# Altium footprint library hphonglib.PcbLib: 1250 footprints (part 77 of 79)
Each footprint in its own frame and in the unit in brackets; x right, y up, seen from the top. Pads: shape width x height; smd on the part's side, far side on the other; paste and mask are expansions set on the pad; w line width, h text height; cw(c..) or ccw(c..) is an arc to the next point about the centre after c.
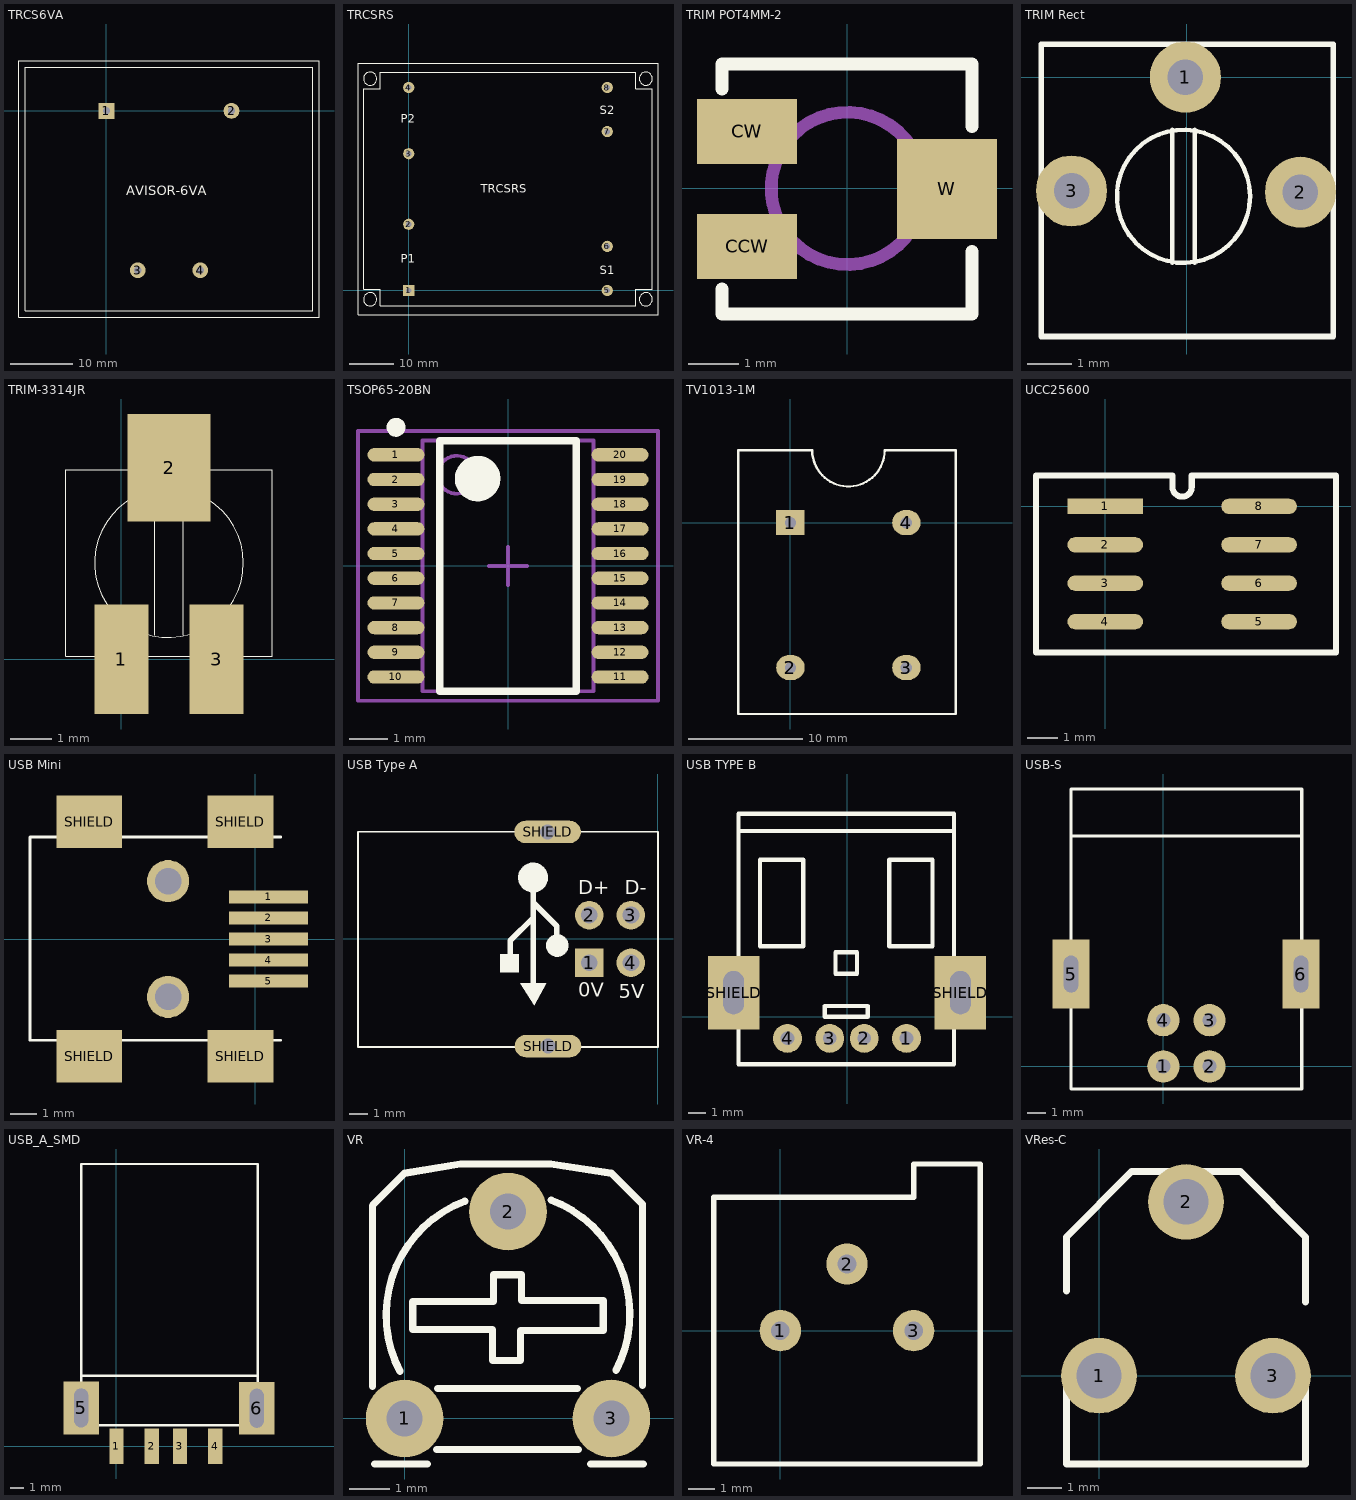
[diagram p76: the footprints below, top view; thin cyan lines are the x and y axes]

## TRCS6VA [mm] "Transformer"
pads (4):
  rect 2.54x2.54 hole 1.2: 1(0,0)
  round 2.54 hole 1.2: 2(20,0) 3(5,-25.5) 4(15,-25.5)
Top Overlay:
  lines w0.127: -14,-33 34,-33 34,8 -14,8 -14,-33 ; -13,-32 33,-32 33,7 -13,7 -13,-32
  text "AVISOR-6VA" at 3.175,-13.462 h1.54

## TRCSRS [mm] "Transformer Power 6VA - Body 68x57 mm RS type"
pads (8):
  rect 2.54x2.54 hole 1.2: 1(0,0)
  round 2.54 hole 1.2: 2(0,15) 3(0,31) 4(0,46) 5(45,0) 6(45,10) 7(45,36) 8(45,46)
Top Overlay:
  circle w0.127: c53.75,-2 r1.5
  circle w0.127: c53.75,48 r1.5
  circle w0.127: c-8.75,48 r1.5
  circle w0.127: c-8.75,-2 r1.5
  lines w0.127: -11.5,-5.5 -11.5,51.5 56.5,51.5 56.5,-5.5 -11.5,-5.5 ; -10.25,0.25 -10.25,45.75 -6.5,45.75 -6.5,49.5 51.5,49.5 51.5,45.75 55.25,45.75 55.25,0.25 51.5,0.25 51.5,-3.5 -6.5,-3.5 -6.5,0.25 -10.25,0.25
  text "S1" at 43.278,3.695 h1.93
  text "S2" at 43.278,39.89 h1.93
  text "P1" at -1.807,6.235 h1.93
  text "P2" at -1.807,37.985 h1.93
  text "TRCSRS" at 16.308,22.11 h1.93

## TRIM POT4MM-2 [mm] "Bien tro tinh chinh"
pads (3):
  rect 2x1.3 smd: CCW(-2.008,-1.162) CW(-2.008,1.138)
  rect 2x2 smd: W(1.992,-0.012)
Top Overlay:
  lines w0.254: -2.508,-2.012 -2.508,-2.512 2.492,-2.512 2.492,-1.262 ; -2.508,1.988 -2.508,2.488 2.492,2.488 2.492,1.238
Mechanical 2:
  circle w0.254: c0,0 r1.524
3D body: height 3.05, standoff 0, extent -1.519,0.132 1.519,1.525
3D body: height 3.05, standoff 0, extent -1.519,-1.525 1.519,-0.132
3D body: height 0.64, standoff 0, extent 1.143,-0.889 2.921,0.889
3D body: height 0.64, standoff 0, extent -2.921,-1.651 -1.143,-0.635
3D body: height 0.64, standoff 0, extent -2.921,0.635 -1.143,1.651
3D body: height 2.54, standoff 0, extent -2.54,-2.413 2.54,2.413
3D body: height 2.67, standoff 0, extent -1.436,-1.436 1.436,1.436

## TRIM Rect [mm]
pads (3):
  round 1.6 hole 0.8: 1(-0.025,0) 2(2.565,-2.591) 3(-2.591,-2.565)
Top Overlay:
  circle w0.1: c-0.069,-2.686 r1.5
  lines w0.1: -0.319,-4.186 -0.319,-1.186 ; 0.181,-4.186 0.181,-1.186
  lines w0.127: -3.277,-5.842 3.302,-5.842 3.302,0.737 -3.277,0.737 -3.277,-5.842
3D body "POT1.STEP": height 4.4, standoff -3, extent -3.275,-5.867 3.325,0.733

## TRIM-3314JR [mm]
pads (3):
  rect 1.3x2.65 smd: 1(0,0) 3(2.3,0)
  rect 2x2.6 smd: 2(1.15,4.625)
Top Overlay:
  circle w0.025: c1.15,2.325 r1.8
  lines w0.025: 0.8,0.575 0.8,4.075 ; 1.5,0.575 1.5,4.075 ; -1.35,0.075 3.65,0.075 3.65,4.575 -1.35,4.575 -1.35,0.075

## TSOP65-20BN [mm] "TSOP, 20-Leads, Body 6.5x4.4mm, Pitch 0.65mm, IPC Medium Density"
height 1.2
pads (20):
  oval 1.5x0.35 smd: 1(-2.95,2.925) 2(-2.95,2.275) 3(-2.95,1.625) 4(-2.95,0.975) 5(-2.95,0.325) 6(-2.95,-0.325) 7(-2.95,-0.975) 8(-2.95,-1.625) 9(-2.95,-2.275) 10(-2.95,-2.925) 11(2.95,-2.925) 12(2.95,-2.275) 13(2.95,-1.625) 14(2.95,-0.975) 15(2.95,-0.325) 16(2.95,0.325) 17(2.95,0.975) 18(2.95,1.625) 19(2.95,2.275) 20(2.95,2.925)
Top Overlay:
  circle w0.25: c-2.95,3.65 r0.125
  circle w0.6: c-0.8,2.3 r0.3
  lines w0.2: -1.8,-3.3 -1.8,3.3 1.8,3.3 1.8,-3.3 -1.8,-3.3
Mechanical 13:
  circle w0.1: c-1.35,2.4 r0.5
  lines w0.1: -2.25,-3.3 -2.25,3.3 2.25,3.3 2.25,-3.3 -2.25,-3.3
Mechanical 15:
  lines w0.1: -0.5,0 0.5,0 ; 0,-0.5 0,0.5 ; -3.95,-3.55 -3.95,3.55 3.95,3.55 3.95,-3.55 -3.95,-3.55
3D body: height 1.2, standoff 0, extent -2.25,-3.3 2.25,3.3

## TV1013-1M [mm]
pads (4):
  rect 2.5x2.2 / inner rect 2.5x1.2 / far side rect 2.5x2.2 hole 1: 1(0,0)
  oval 2.5x2.2 / inner oval 2.5x1.2 / far side oval 2.5x2.2 hole 1: 2(0,-12.7) 3(10.16,-12.7) 4(10.16,0)
Top Overlay:
  lines w0.2: -4.572,-16.764 14.478,-16.764 14.478,6.35 8.255,6.35 cw(c5.08,6.35) 1.905,6.35 -4.572,6.35 -4.572,-16.764

## UCC25600 [mm] "Half bridge resonant"
pads (8):
  rect 2.5x0.5 smd: 1(0,0)
  oval 2.5x0.5 smd: 2(0,-1.27) 3(0,-2.54) 4(0,-3.81) 5(5.08,-3.81) 6(5.08,-2.54) 7(5.08,-1.27) 8(5.08,0)
Top Overlay:
  lines w0.2: -2.286,-4.826 7.62,-4.826 7.62,1.016 2.857,1.016 2.857,0.635 cw(c2.54,0.635) 2.222,0.635 2.222,1.016 -2.286,1.016 -2.286,-4.826

## USB Mini [mm] "USB Male Mini Type B Conn"
pads (11):
  rect 3x0.5 smd: 1(0.5,1.6) 2(0.5,0.8) 3(0.5,0) 4(0.5,-0.8) 5(0.5,-1.6)
  rect 2.5x2 smd: SHIELD(-6.318,-4.45) SHIELD(-6.318,4.45) SHIELD(-0.568,-4.45) SHIELD(-0.568,4.45)
  round 1.6 hole 1: ""(-3.318,-2.2) ""(-3.318,2.2)
Top Overlay:
  lines w0.1: 0.957,-3.85 -8.568,-3.85 -8.568,3.875 0.957,3.875
  text "." at 1.325,2.6 h0.5
3D body "USB_mini_B.STEP": height 3.95, standoff -1, extent -9.175,-5.375 0.025,5.325

## USB Type A [mm] "USB Male Type B Connector"
pads (6):
  rect 1.524x1.524 hole 0.9: 1(-3.672,-1.27)
  round 1.524 hole 0.9: 2(-3.672,1.27) 3(-1.449,1.27) 4(-1.449,-1.27)
  rrect100% 3.556x1.2 hole 0.8: SHIELD(-5.894,5.715) SHIELD(-5.875,-5.725)
Top Overlay:
  circle w0.6: c-5.382,-0.356 r0.3
  circle w0.8: c-6.674,3.277 r0.4
  region: -8.433,-0.813 -8.433,-1.803 -7.417,-1.803 -7.417,-0.813
  region: -6.617,-3.531 -7.353,-2.362 -5.956,-2.362
  lines w0.1: -16.025,-5.775 -16.025,5.725 0,5.725 0,-5.775 -16.025,-5.775
  lines w0.2: -6.655,1.876 -6.629,1.876 -6.604,1.876
  lines w0.3: -7.899,-0.864 -7.899,-0.127 ; -7.899,-0.102 -6.655,1.143 ; -6.655,-2.464 -6.655,2.718 ; -6.604,1.876 -5.41,0.683 -5.41,-0.279
  lines w0.8: -6.934,5.725 -4.826,5.725 ; -6.915,-5.715 -4.807,-5.715
  text "0V" at -4.267,-3.099 h0.76
  text "D-" at -1.778,2.388 h0.76
  text "D+" at -4.267,2.388 h0.76
  text "5V" at -2.108,-3.175 h0.76
Bottom Overlay:
  circle w0.8: c-6.699,3.277 r0.4
  circle w0.6: c-5.407,-0.356 r0.3
  region: -8.458,-0.813 -8.458,-1.803 -7.442,-1.803 -7.442,-0.813
  region: -6.642,-3.531 -7.379,-2.362 -5.982,-2.362
  lines w0.1: -16.025,-5.775 -16.025,5.725 ; 0,-5.775 0,5.725 ; -16.025,-5.766 -16.025,5.725 ; -16.025,-5.766 0,-5.766 ; -16.025,-5.766 0,-5.766 ; -16.025,5.725 0,5.725 ; -16.025,5.725 0,5.725 ; 0,-5.766 0,5.725
  lines w0.3: -7.925,-0.864 -7.925,-0.127 ; -7.925,-0.102 -6.68,1.143 ; -6.68,-2.464 -6.68,2.718 ; -6.629,1.876 -5.436,0.683 -5.436,-0.279
3D body "USB type B.STEP": height 11.5, standoff -3.92, extent -16.594,-7.442 0.406,7.441

## USB TYPE B [mil] "Connector; USB; Type B; Solder Pad 35mil"
pads (6):
  round 67 hole 32: 1(138,-50) 2(40,-50) 3(-40,-50) 4(-138,-50)
  rect 120x170 hole 48 slot 100 at 90 deg: SHIELD(-263,56) SHIELD(263,56)
Top Overlay:
  lines w10: -251.77,-100 -251.77,431 248.23,431 248.23,-100 ; -251.77,-110 248.23,-110 248.23,471 -251.77,471 -251.77,-110 ; -201.77,164 -101.77,164 -101.77,364 -201.77,364 -201.77,164 ; -51.77,0 -1.77,0 48.23,0 48.23,25 -51.77,25 -51.77,0 ; -26.77,100 -26.77,150 23.23,150 23.23,100 -26.77,100 ; 98.23,164 198.23,164 198.23,364 98.23,364 98.23,164
3D body "usb_a-usbsa.stp": height 275.59, standoff -151.76, extent -311.02,-105 311.02,465.87

## USB-S [mil] "USB B connector, 4pin, For Print"
height 100
pads (6):
  round 70 hole 31: 1(0,0) 2(100,0) 3(100,100) 4(0,100)
  rect 80x150 hole 31 slot 80 at 90 deg: 5(-200,200) 6(298,200)
Top Overlay:
  lines w7: -200,499 300,499 ; -200,-49 -200,601 300,601 300,-49 -200,-49
3D body "usb_a-usbsb.stp": height 421.26, standoff -155.51, extent -243.31,-39.61 343.31,610

## USB_A_SMD [mil] "For USB SMD"
height 150
pads (6):
  rect 40x100 smd: 1(0,0) 2(100,0) 3(180,0) 4(280,0)
  rect 100x150 hole 40 slot 110 at 90 deg: 5(-100,109) 6(398,108)
Top Overlay:
  lines w7: -100,200 400,200 ; -100,60 -100,800 400,800 400,60 -100,60
3D body "SW3dPS-USB Series A Plug.STEP": height 73.83, standoff -103.33, extent -93.44,62.17 379,783.83

## VR [mil] "Resistor Variable"
height 200
pads (3):
  round 75 hole 35: 1(0,0) 2(100,200) 3(200,0)
Top Overlay:
  lines w7: -31,31 -31,206 0,237 54,246 141.5,246 200,237 230,207 230,32 ; -29,-44 22,-44 ; -4.35,45.34 cw(c100,100) 58.1,210.1 ; 8,113 8,86 85,86 85,56 112,56 112,85 192,85 192,114 113,114 113,139 86,139 86,113 9,113 ; 31,-30 168,-30 ; 32,29 167,29 ; 141.9,211.1 cw(c100,101) 204.35,46.34 ; 180,-44 231,-44
3D body "SW3dPS-Trimpot Horizontal.STEP": height 165.35, standoff -220.47, extent -86.85,-30 306.85,371.57

## VR-4 [mil]
pads (3):
  round 62 hole 28: 1(0,0) 2(100,100) 3(200,0)
Top Overlay:
  lines w8: -100,-200 300,-200 300,250 200,250 200,200 -100,200 -100,-200

## VRes-C [mil] "Potentiometer; 3 Leads; Circle; Solder pad 35mil"
pads (3):
  round 87 hole 52: 1(0,0) 2(100,200) 3(200,0)
Top Overlay:
  lines w8: -37.5,-90.23 -37.5,-2.73 -37.5,-101.5 237.5,-101.5 237.5,9.77 237.5,-90.23 ; -37.5,159.77 37.5,234.77 ; -37.5,159.77 -37.5,97.27 -37.5,159.77 ; -37.5,159.77 37.5,234.77 ; 37.5,234.77 162.5,234.77 ; 37.5,234.77 162.5,234.77 ; 162.5,234.77 237.5,159.77 ; 162.5,234.77 237.5,159.77 ; 237.5,159.77 237.5,84.77 237.5,159.77
3D body "User Library-Trimmer, 3306F-1.STEP": height 300, standoff -119.49, extent -34.55,-96.87 233.56,228